# Altium footprint library LDCN Components.PcbLib: 426 footprints (part 13 of 27)
Each footprint in its own frame and in the unit in brackets; x right, y up, seen from the top. Pads: shape width x height; smd on the part's side, far side on the other; paste and mask are expansions set on the pad; w line width, h text height; cw(c..) or ccw(c..) is an arc to the next point about the centre after c.
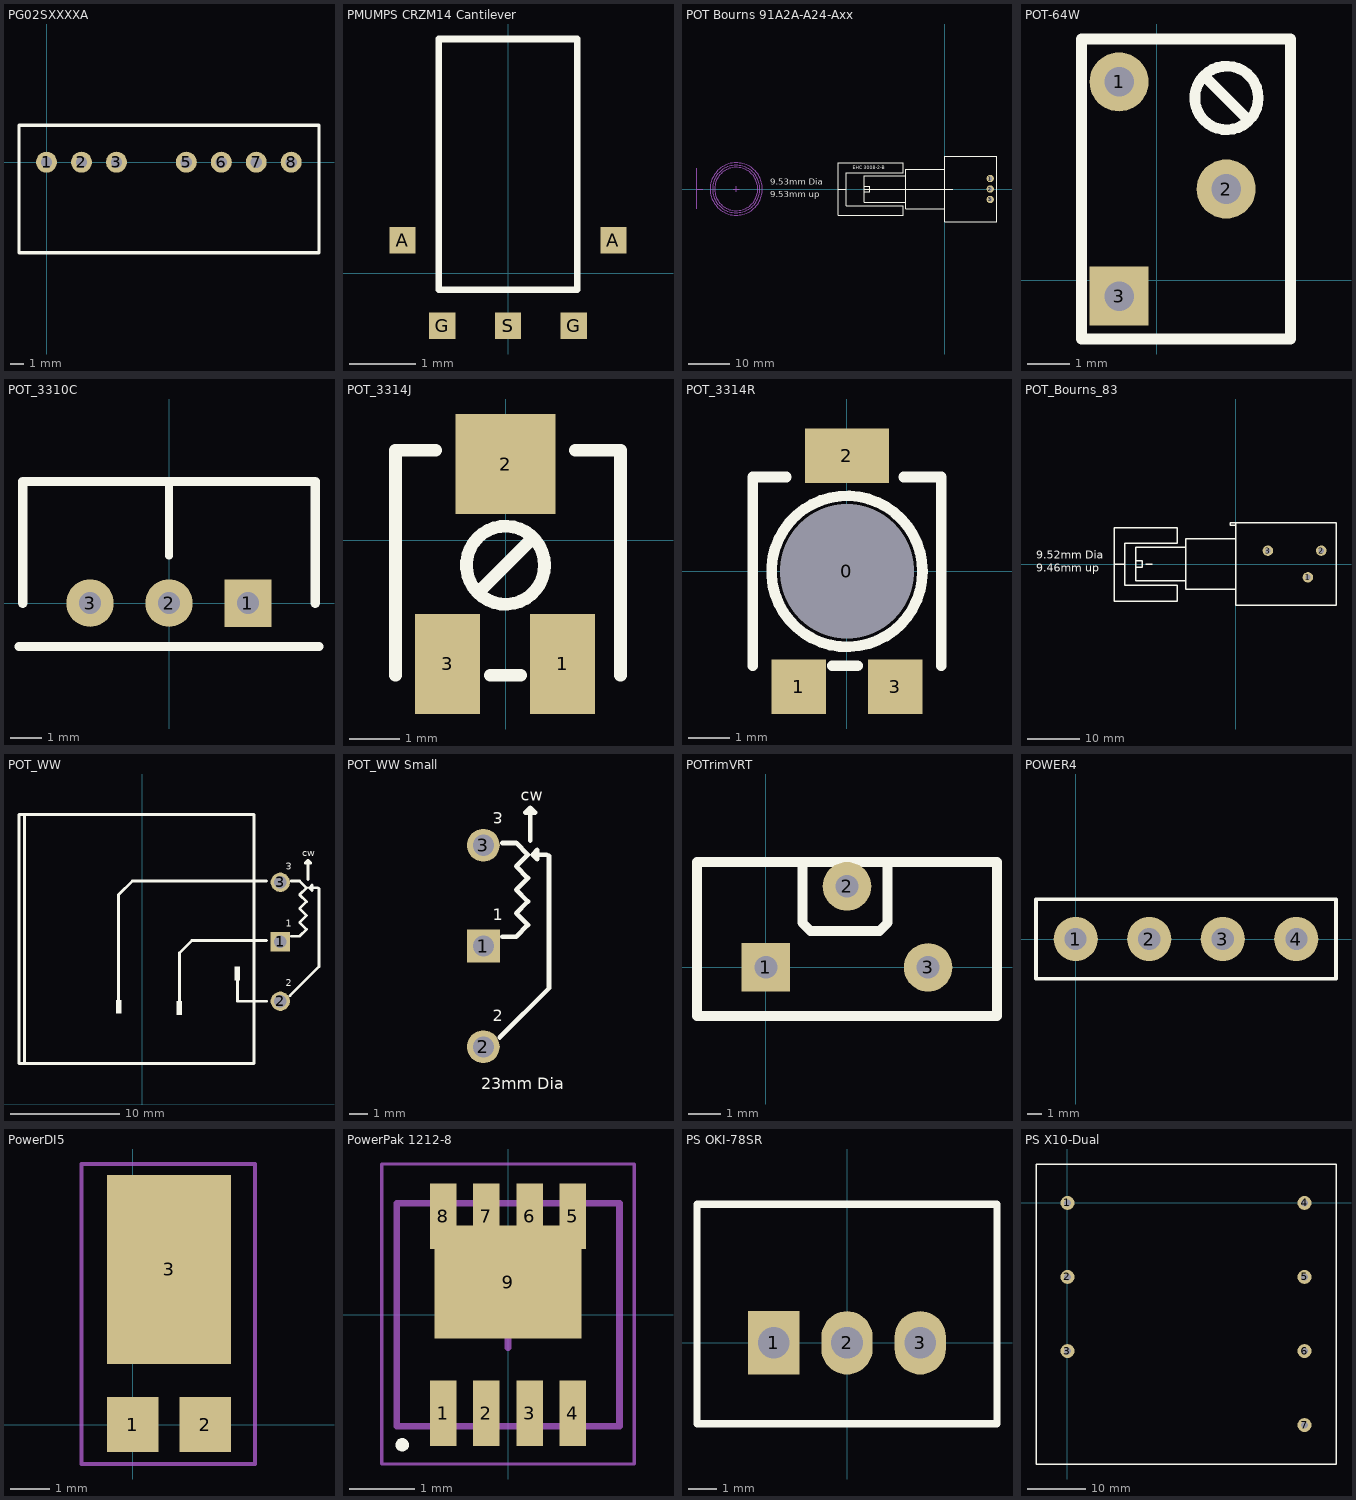
[diagram p12: the footprints below, top view; thin cyan lines are the x and y axes]

## PG02SXXXXA [mil] "PG02S DC-DC SIP Package"
height 440.94
pads (7):
  round 60 hole 32: 1(0,0) 2(100,0) 3(200,0) 5(400,0) 6(500,0) 7(600,0) 8(700,0)
Top Overlay:
  lines w10: -78.74,-259.84 779.53,-259.84 779.53,106.3 -78.74,106.3 -78.74,-259.84

## PMUMPS CRZM14 Cantilever [mm] "PiezoMumps Cantilever"
height 0.5
pads (5):
  rect 0.4x0.4 smd: A(-1.6,0.5) A(1.6,0.5) G(-1,-0.8) G(1,-0.8) S(0,-0.8)
Top Overlay:
  lines w0.1: -1.05,-0.25 1.05,-0.25 1.05,3.55 -1.05,3.55 -1.05,-0.25
3D body "AFM Cantilever.SLDPRT": height 0.3, standoff 0, extent -0.8,0 0.8,3.45

## POT Bourns 91A2A-A24-Axx [mm] "PCB mount pot 91A2A-A24-Axx"
height 16
pads (3):
  round 1.8 hole 0.9: 1(11.05,2.54) 2(11.05,0) 3(11.05,-2.54)
Top Overlay:
  lines w0.254: -25.885,-0.051 -23.885,-0.051 ; -19.5,-0.635 -18.23,-0.635 -18.23,0.635 -19.5,0.635 ; -19.5,0 1.9,0 ; -9.525,-3.175 -19.5,-3.175 -19.5,3.175 -9.525,3.175 ; 0,-4.763 -9.5,-4.763 -9.5,4.763 0,4.763 ; -25.885,-6.35 -10.01,-6.35 -10.01,-4.064 -23.885,-4.064 -23.885,3.949 -10.01,3.949 -10.01,6.35 -25.885,6.35 -25.885,-6.35 ; 0,-7.95 12.7,-7.95 12.7,7.95 0,7.95 0,0 0,-7.95
  text "9.53mm up" at -42.3,-1.956 h1.52
  text "9.53mm Dia" at -42.3,1 h1.52
  text "EHC 3008-2-B" at -22.375,4.825 h0.76
Mechanical 21:
  circle w0.254: c-50.6,0 r5.25
Mechanical 22:
  lines w0.254: -60.13,-4.8 -60.13,0 ; -60.13,5 -60.13,0 ; -58.73,0 -60.13,0 ; -51.3,0 -49.9,0 ; -50.6,-0.7 -50.6,0.7
Mechanical 24:
  circle w0.254: c-50.6,0 r6.35
Mechanical 25:
  circle w0.254: c-50.6,0 r5.75

## POT-64W [mm] "TT Electronics 64W Series"
height 6.8
pads (3):
  round 1.4 hole 0.7: 1(-0.889,4.699) 2(1.651,2.159)
  rect 1.4x1.4 hole 0.7: 3(-0.889,-0.381)
Top Overlay:
  circle w0.254: c1.66,4.318 r0.753
  lines w0.254: 1.206,4.763 2.159,3.81 ; -1.778,-1.397 3.175,-1.397 3.175,5.715 -1.778,5.715 -1.778,-1.397

## POT_3310C [mil] "Bourns 3310C series"
height 314.96
pads (3):
  rect 60x60 hole 28: 1(100,0)
  round 60 hole 28: 2(0,0) 3(-100,0)
Top Overlay:
  lines w10: 0,60 0,154
  lines w12: -190,-55 190,-55 ; -185,0 -185,154 185,154 185,0

## POT_3314J [mm]
pads (3):
  rect 1.3x2 smd: 1(1.143,-2.476) 3(-1.157,-2.476)
  rect 2x2 smd: 2(0,1.524)
Top Overlay:
  circle w0.254: c0,-0.5 r0.781
  lines w0.254: -2.2,-2.7 -2.2,1.8 -1.4,1.8 ; -0.3,-2.7 0.3,-2.7 ; 0.5,0 -0.5,-1 ; 2.3,-2.7 2.3,1.8 1.4,1.8 ; -1.4,1.8 -1.4,1.8 ; -0.5,-1 -0.5,-1 ; 1.4,1.8 1.4,1.8

## POT_3314R [mm]
pads (4):
  round 1 hole 3.2 unplated: 0(0,0)
  rect 1.3x1.3 smd: 1(-1.15,-2.75) 3(1.15,-2.75)
  rect 2x1.3 smd: 2(0,2.75)
Top Overlay:
  circle w0.254: c0,0 r1.8
  lines w0.254: -2.25,-2.25 -2.25,2.25 -1.45,2.25 ; -0.35,-2.25 0.25,-2.25 ; 2.25,-2.25 2.25,2.25 1.35,2.25 ; -1.45,2.25 -1.45,2.25 ; 1.35,2.25 1.35,2.25 ; -0.5,-0.5 -0.5,-0.5

## POT_Bourns_83 [mm] "PCB mount pot"
height 16
pads (3):
  round 2 hole 1: 1(13.716,-2.54) 2(16.256,2.54) 3(6.096,2.54)
Top Overlay:
  lines w0.254: -23.095,-0.051 -21.095,-0.051 ; -19.05,-0.635 -17.78,-0.635 -17.78,0.635 -19.05,0.635 ; -17.145,0 -15.875,0 ; -9.525,-3.175 -19.05,-3.175 -19.05,3.175 -9.525,3.175 ; 0,-4.763 -9.525,-4.763 -9.525,4.763 0,4.763 ; 0,7.366 -1.016,7.366 -1.016,7.874 0,7.874 ; 0,7.874 0,0 0,-7.874 19.05,-7.874 19.05,0 19.05,7.874 0,7.874 ; -23.095,-7.051 -11.095,-7.051 -11.095,-4.064 -21.095,-4.064 -21.095,3.949 -11.095,3.949 -11.095,6.936 -23.095,6.936 -23.095,-7.051
  text "9.52mm Dia" at -38,1 h1.52
  text "9.46mm up" at -38,-1.5 h1.52

## POT_WW [mil] "Panel Mount Pot 22mm Wirewound"
pads (3):
  rect 70x70 hole 45: 1(500,590)
  round 70 hole 45: 2(500,375) 3(500,805)
Top Overlay:
  rectangle: 335,450 355,500
  rectangle: 125,325 145,375
  rectangle: -95,330 -75,380
  lines w10: -425,150 -425,1050 ; -90,350 -85,345 -85,615 -85,760 -35,810 450,810 ; 135,360 135,550 180,595 450,595 ; 345,485 345,375 450,375 ; 535,395 640,500 640,782.93 635,785 625,785 605,785 ; 540,610 570,610 595,635 570,660 595,685 570,710 595,735 570,760 595,785 570,810 540,810 ; 600,815 600,885 ; 600,885 610,875 590,875 600,885 ; 605,785 615,775 615,795 605,785 ; -445,150 -445,1050 405,1050 405,150 -445,150
  text "cw" at 580,900 h25
  text "3" at 520,875 h25
  text "2" at 520,430 h25
  text "1" at 520,645 h25

## POT_WW Small [mil] "Panel Mount Pot 22mm Wirewound"
pads (3):
  rect 70x70 hole 45: 1(500,590)
  round 70 hole 45: 2(500,375) 3(500,805)
Top Overlay:
  lines w10: 535,395 640,500 640,782.93 635,785 625,785 605,785 ; 540,610 570,610 595,635 570,660 595,685 570,710 595,735 570,760 595,785 570,810 540,810 ; 600,815 600,885 ; 600,885 590,875 610,875 600,885 ; 605,785 615,795 615,775 605,785
  text "23mm Dia" at 495,285 h25
  text "1" at 520,645 h25
  text "2" at 520,430 h25
  text "3" at 520,875 h25
  text "cw" at 580,900 h25

## POTrimVRT [mil] "Bournes 3386H"
height 393.7
pads (3):
  rect 60x60 hole 28: 1(0,0)
  round 60 hole 28: 2(100,100) 3(200,0)
Top Overlay:
  lines w12: 45,130 45,55 55,45 140,45 150,55 150,130 ; -85,-60 -85,130 285,130 285,-60 -85,-60

## POWER4 [mm]
pads (4):
  round 3 hole 1.5: 1(0,0) 2(5,0) 3(10,0) 4(15,0)
Top Overlay:
  lines w0.254: -2.7,-2.7 17.7,-2.7 17.7,2.7 -2.7,2.7 -2.7,-2.7

## PowerDI5 [mm] "PowerDI5 from Diodes Inc"
height 1.6
pads (3):
  rect 1.3x1.4 smd: 1(0,0) 2(1.84,0)
  rect 3.14x4.8 smd: 3(0.92,3.947)
Mechanical 15:
  lines w0.102: -1.3,-1 -1.3,6.621 3.1,6.621 3.1,-1 -1.3,-1
3D body: height 2.38, standoff 0, extent -1.1,-0.3 2.9,6.095

## PowerPak 1212-8 [mm] "PowerPak 1212-8"
height 1
pads (9):
  rect 0.405x1 smd: 1(-0.99,-1.5) 2(-0.33,-1.5) 3(0.33,-1.5) 4(0.99,-1.5) 5(0.99,1.5) 6(0.33,1.5) 7(-0.33,1.5) 8(-0.99,1.5)
  rect 2.235x1.725 smd: 9(0,0.5)
Top Overlay:
  region: -1.713,-1.983 -1.713,-2.003 -1.698,-2.039 -1.67,-2.067 -1.633,-2.083 -1.613,-2.083 -1.593,-2.083 -1.557,-2.067 -1.528,-2.039 -1.513,-2.003 -1.513,-1.983 -1.513,-1.963 -1.528,-1.926 -1.557,-1.898 -1.593,-1.883 -1.613,-1.883 -1.633,-1.883 -1.67,-1.898 -1.698,-1.926 -1.713,-1.963
Mechanical 13:
  lines w0.1: -1.7,-1.7 -1.7,1.7 1.7,1.7 1.7,-1.7 -1.7,-1.7
Mechanical 15:
  lines w0.05: -1.925,-2.275 -1.925,2.3 1.925,2.3 1.925,-2.275 -1.925,-2.275
  lines w0.1: -0.5,0 0.5,0 ; 0,-0.5 0,0.5
3D body: height 1, standoff 0, extent -1.7,-1.7 1.7,1.7

## PS OKI-78SR [mm] "OKI-78SR"
height 16.5
pads (3):
  rect 1.778x2.2 hole 1.1: 1(-2.54,0)
  oval 1.778x2.2 hole 1.1: 2(0,0) 3(2.54,0)
Top Overlay:
  lines w0.254: -5.2,-2.8 -5.2,4.8 0,4.8 5.2,4.8 5.2,-2.8 0,-2.8 -5.2,-2.8

## PS X10-Dual [mm] "APD X10 Dual"
height 13
pads (7):
  round 2.4 hole 1.2: 1(0,0) 2(0,-12.7) 3(0,-25.4) 4(40.64,0) 5(40.64,-12.7) 6(40.64,-25.4) 7(40.64,-38.1)
Top Overlay:
  lines w0.254: -5.4,-44.77 -5.4,6.67 46.04,6.67 46.04,-44.77 -5.4,-44.77